# Altium footprint library Comp LIb.PcbLib: 34 footprints (part 2 of 3)
Each footprint in its own frame and in the unit in brackets; x right, y up, seen from the top. Pads: shape width x height; smd on the part's side, far side on the other; paste and mask are expansions set on the pad; w line width, h text height; cw(c..) or ccw(c..) is an arc to the next point about the centre after c.
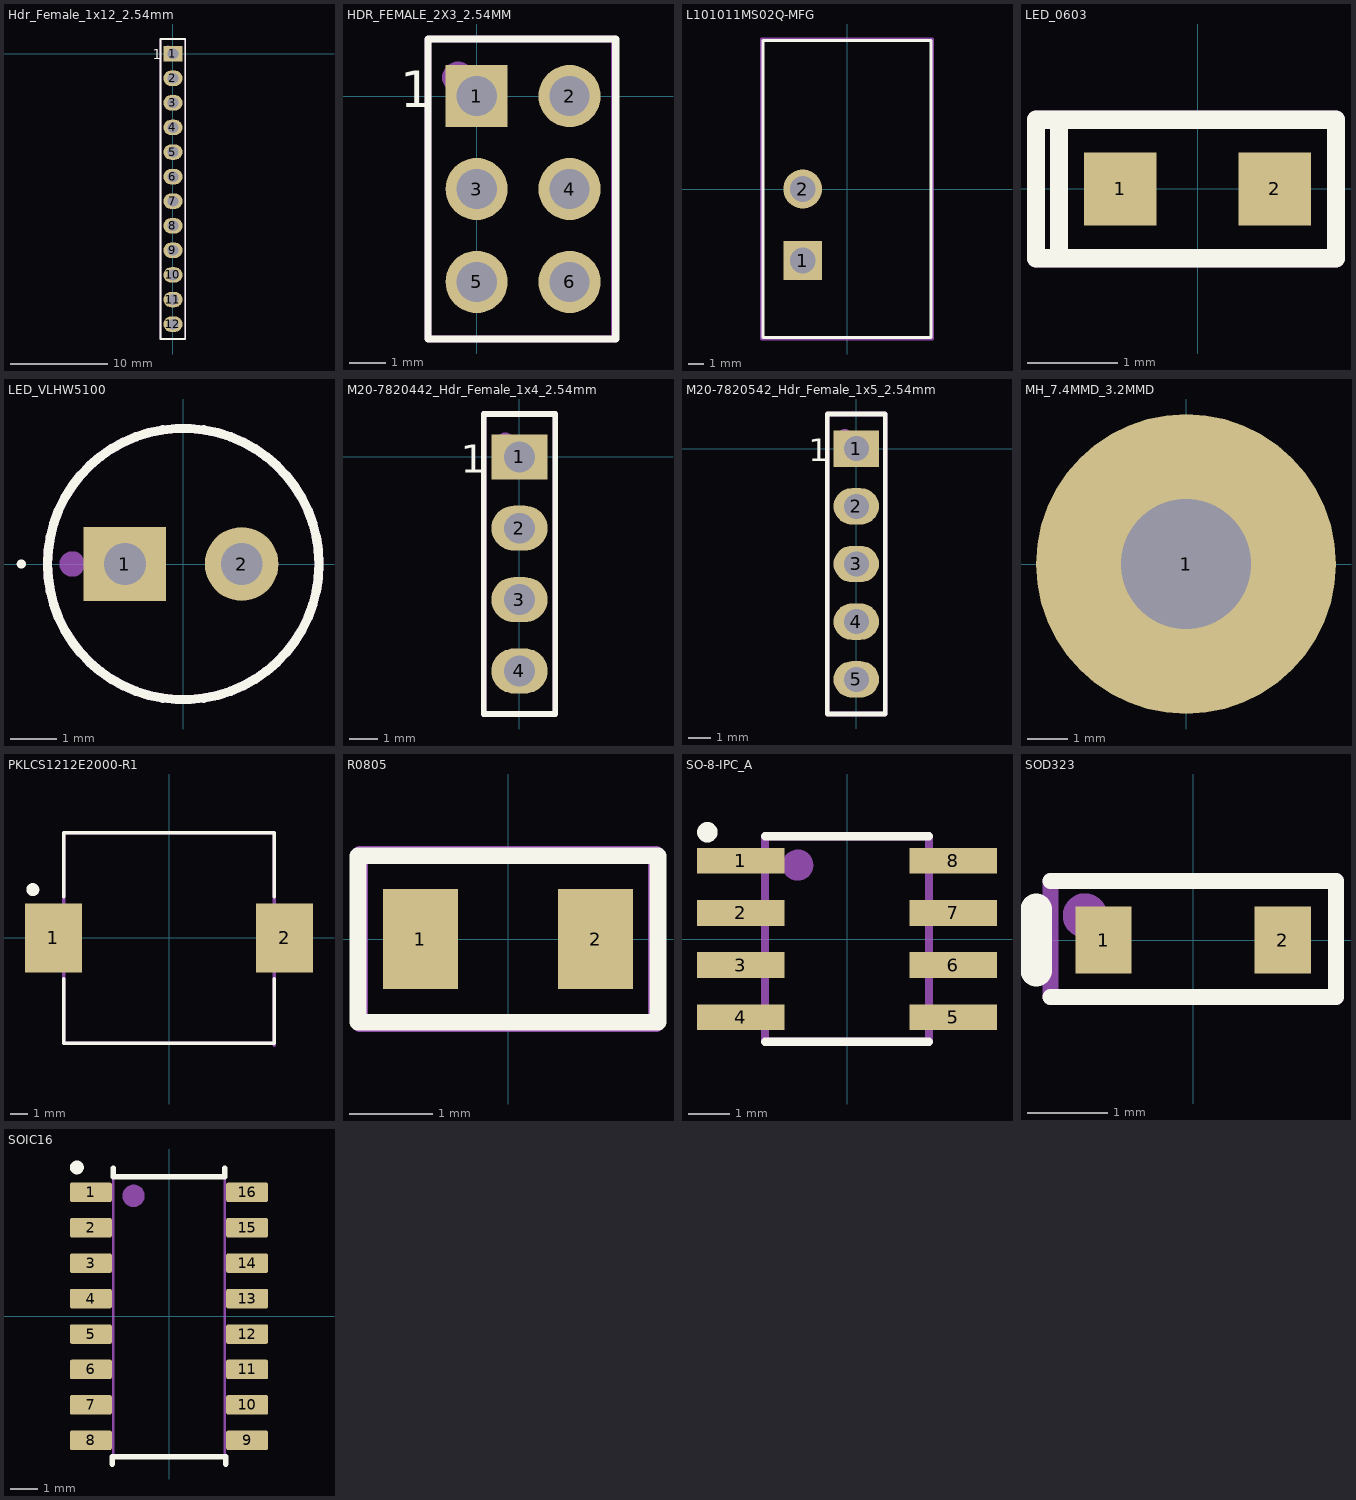
[diagram p1: the footprints below, top view; thin cyan lines are the x and y axes]

## Hdr_Female_1x12_2.54mm [mm]
pads (12):
  rect 2x1.6 hole 1.1: 1(0,0)
  oval 2x1.6 hole 1.1: 2(0,-2.54) 3(0,-5.08) 4(0,-7.62) 5(0,-10.16) 6(0,-12.7) 7(0,-15.24) 8(0,-17.78) 9(0,-20.32) 10(0,-22.86) 11(0,-25.4) 12(0,-27.94)
Top Overlay:
  lines w0.2: -1.27,-29.48 1.27,-29.48 ; -1.27,-29.464 -1.27,1.524 ; -1.27,-24.384 -1.27,1.524 ; 1.27,-29.464 1.27,1.524 ; 1.27,-24.384 1.27,1.524 ; -1.27,1.524 1.27,1.524 ; -1.27,1.524 1.27,1.524
  text "1" at -2.086,-0.562 h1
Mechanical 29:
  circle w0.5: c-0.508,0.508 r0.1
  lines w0.2: -1.27,-29.48 1.27,-29.48 ; -1.27,-29.464 -1.27,1.524 ; -1.27,-24.384 -1.27,1.524 ; 1.27,-29.464 1.27,1.524 ; 1.27,-24.384 1.27,1.524 ; -1.27,1.524 1.27,1.524 ; -1.27,1.524 1.27,1.524
  text ".Designator" at 0.878,-16.972 h1.8
3D body "m20-7821242.stp": height 8.51, standoff -2.99, extent -1.27,-29.41 1.23,1.47

## HDR_FEMALE_2X3_2.54MM [mm]
pads (6):
  rect 1.7x1.7 hole 1.1: 1(0,0)
  round 1.7 hole 1.1: 2(2.54,0) 3(0,-2.54) 4(2.54,-2.54) 5(0,-5.08) 6(2.54,-5.08)
Top Overlay:
  lines w0.2: -1.33,-6.64 3.8,-6.64 3.8,1.56 -1.33,1.56 -1.33,-6.64
  text "1" at -2.086,-0.308 h1
Mechanical 29:
  circle w0.508: c-0.508,0.508 r0.18
  lines w0.2: -1.33,-6.64 3.77,-6.64 3.77,1.56 -1.33,1.56 -1.33,-6.64
  text ".Designator" at 1.651,-4.064 h1.52
3D body "m20-7830342.stp": height 8.51, standoff -2.99, extent -1.33,-6.55 3.71,1.47

## L101011MS02Q-MFG [mm]
pads (2):
  rect 2.5x2.5 hole 1.65 paste-2539.97 mask+0: 1(-2.85,-4.6)
  round 2.5 hole 1.65 paste-2539.97 mask+0: 2(-2.85,0)
Top Overlay:
  lines w0.2: -5.395,-9.55 5.395,-9.55 5.395,9.55 -5.395,9.55 -5.395,-9.55
Mechanical 29:
  lines w0.2: -5.495,-9.65 -5.495,9.65 5.495,9.65 5.495,-9.65 -5.495,-9.65
  text ".Designator" at 1.293,-5.261 h2
3D body "Switch_C&K_Components_L101011MS02Q_eec.STEP": height 14.17, standoff -3.83, extent -5.397,-9.55 5.399,9.55

## LED_0603 [mm]
pads (2):
  rect 0.8x0.8 smd: 1(-0.85,0) 2(0.85,0)
Top Overlay:
  lines w0.2: -1.524,-0.762 -1.778,-0.762 -1.778,0.762 -1.524,0.762 ; -1.524,-0.762 -1.524,0.762 ; -1.524,-0.762 1.524,-0.762 1.524,0.762 -1.524,0.762
Mechanical 29:
  lines w0.2: -1.524,-0.762 -1.524,0.762 ; -1.778,-0.762 -1.778,0.762 1.524,0.762 1.524,-0.762 -1.778,-0.762
  text "--.Designator" at -0.916,-0.208 h0.6
3D body "SML-D12U8WT86.STEP": height 0.56, standoff 0.01, extent -0.8,-0.4 0.8,0.4
3D body: height 0.58, standoff 0.5, extent -0.2,-0.2 0.2,0.2

## LED_VLHW5100 [mm]
pads (2):
  rect 1.8x1.6 hole 0.91: 1(-1.27,0)
  round 1.6 hole 0.91: 2(1.27,0)
Top Overlay:
  lines w0.1: -3.57,0 ccw(c-3.52,0) -3.47,0 ccw(c-3.52,0) -3.57,0
  lines w0.2: -2.95,0 cw(c0,0) 2.95,0 cw(c0,0) -2.95,0
Mechanical 29:
  circle w0.3: c-2.413,0 r0.127
  lines w0.2: -2.95,0 cw(c0,0) 2.95,0 cw(c0,0) -2.95,0
  text ".Designator" at -2.186,-0.456 h1
3D body "80463LED_5mm_VLHW51.stp": height 8.6, standoff -16.4, extent -2.5,-2.945 2.938,2.945

## M20-7820442_Hdr_Female_1x4_2.54mm [mm] "comp: M20-7820442"
pads (4):
  rect 2x1.6 hole 1.1: 1(0,0)
  oval 2x1.6 hole 1.1: 2(0,-2.54) 3(0,-5.08) 4(0,-7.62)
Top Overlay:
  lines w0.2: -1.27,1.524 -1.27,-9.15 1.27,-9.15 1.27,1.524 ; -1.27,1.524 1.27,1.524 ; -1.27,1.524 1.27,1.524
  text "1" at -2.086,-0.562 h1
Mechanical 29:
  circle w0.5: c-0.508,0.508 r0.1
  lines w0.2: -1.27,-9.15 -1.27,1.524 ; -1.27,-9.15 -1.27,1.524 ; -1.27,-9.15 1.27,-9.15 ; -1.27,1.524 1.27,1.524 ; -1.27,1.524 1.27,1.524 ; 1.27,-9.15 1.27,1.524 ; 1.27,-9.15 1.27,1.524
  text ".Designator" at 0.517,-6.15 h1.3
3D body "m20-7820442.stp": height 8.51, standoff -2.99, extent -1.27,-9.093 1.23,1.467

## M20-7820542_Hdr_Female_1x5_2.54mm [mm] "comp: M20-7820542"
pads (5):
  rect 2x1.6 hole 1.1: 1(0,0)
  oval 2x1.6 hole 1.1: 2(0,-2.54) 3(0,-5.08) 4(0,-7.62) 5(0,-10.16)
Top Overlay:
  lines w0.2: -1.27,1.524 -1.27,-11.684 1.27,-11.684 1.27,1.524 ; -1.27,1.524 1.27,1.524 ; -1.27,1.524 1.27,1.524
  text "1" at -2.086,-0.562 h1
Mechanical 29:
  circle w0.5: c-0.508,0.508 r0.1
  lines w0.2: -1.27,-11.303 -1.27,1.524 ; 1.27,-11.303 1.27,1.524 ; -1.27,1.524 -1.27,-11.684 1.27,-11.684 1.27,1.524 ; -1.27,1.524 1.27,1.524 ; -1.27,1.524 1.27,1.524
  text ".Designator" at 0.791,-8.69 h1.6
3D body "m20-7820542.stp": height 8.51, standoff -2.99, extent -1.27,-11.63 1.23,1.47

## MH_7.4MMD_3.2MMD [mm]
pads (1):
  round 7.4 hole 3.2: 1(0,0)

## PCBComponent_1 [mm]

## PCBComponent_1 - duplicate [mm]

## PCBComponent_1 - duplicate1 [mm]

## PKLCS1212E2000-R1 [mm] "PKLCS1212E2000-R1"
pads (2):
  rect 3.3x4 smd paste+0 mask+0: 1(-6.7,0) 2(6.7,0)
Top Overlay:
  circle w0.5: c-7.9,2.8 r0.125
  lines w0.2: -6.1,-2.375 -6.1,-6.1 6.1,-6.1 6.1,-2.375 ; -6.1,2.375 -6.1,6.1 6.1,6.1 6.1,2.375
Mechanical 29:
  lines w0.2: 6.096,-6.223 6.096,6.096 -6.096,6.096 -6.096,-6.096 6.096,-6.096
  text ".Designator" at -3.61,-1.039 h2
3D body "Speak_Murata_PKLCS1212E2400-R1_eec.STEP": height 3, standoff 0, extent -6,-6 6,6

## R0805 [mm]
pads (2):
  rect 0.9x1.2 smd: 1(-1.05,0) 2(1.05,0)
Top Overlay:
  lines w0.2: -1.8,-1 1.8,-1 1.8,1 -1.8,1 -1.8,-1
Mechanical 29:
  lines w0.2: -1.778,-1.016 -1.778,1.016 1.778,1.016 1.778,-1.016 -1.778,-1.016
  text ".Designator" at -1.12,-0.218 h0.8
3D body "RC0805N_YAG.step": height 0.72, standoff 0.01, extent -1.003,-0.597 1.003,0.597

## SO-8-IPC_A [mm]
pads (8):
  rect 2.135x0.625 smd paste+0: 1(-2.586,1.905) 2(-2.586,0.635) 3(-2.586,-0.635) 4(-2.586,-1.905) 5(2.586,-1.905) 6(2.586,-0.635) 7(2.586,0.635) 8(2.586,1.905)
Top Overlay:
  circle w0.25: c-3.4,2.6 r0.125
  lines w0.2: -2,-2.5 2,-2.5 ; -2,2.5 2,2.5
Mechanical 29:
  circle w0.4: c-1.2,1.8 r0.18
  lines w0.2: -2,-2.5 2,-2.5 2,2.5 -2,2.5 -2,-2.5
  text ".Designator" at -1.05,-0.586 h2.2
3D body "Trans_Vishay_SI4848ADY-T1-GE3_eec.STEP": height 1.75, standoff 0, extent -3,-2.45 3,2.45

## SOD323 [mm]
pads (2):
  rect 0.7x0.83 smd: 1(-1.115,0) 2(1.115,0)
Top Overlay:
  lines w0.2: -1.778,-0.711 1.778,-0.711 1.778,0.737 -1.778,0.737
  lines w0.4: -1.956,-0.381 -1.956,0.381
Mechanical 29:
  circle w0.3: c-1.346,0.305 r0.127
  lines w0.2: -1.778,-0.711 1.778,-0.711 1.778,0.737 -1.778,0.737 -1.778,-0.711
  text ".Designator" at -0.8,-0.167 h0.4
3D body "User Library-SOD323.step": height 1, standoff 0.01, extent -1.25,-0.61 1.25,0.64

## SOIC16 [mm] "SOIC, 16-Leads, Body 10x4mm, Pitch 1.27mm, IPC High Density"
height 1.75
pads (16):
  rrect18% 1.5x0.7 smd: 1(-2.8,4.445) 2(-2.8,3.175) 3(-2.8,1.905) 4(-2.8,0.635) 5(-2.8,-0.635) 6(-2.8,-1.905) 7(-2.8,-3.175) 8(-2.8,-4.445) 9(2.8,-4.445) 10(2.8,-3.175) 11(2.8,-1.905) 12(2.8,-0.635) 13(2.8,0.635) 14(2.8,1.905) 15(2.8,3.175) 16(2.8,4.445)
Top Overlay:
  circle w0.25: c-3.302,5.334 r0.125
  lines w0.2: -2.032,-5.293 -2.032,-5.039 1.968,-5.039 ; -2,5.3 -2,5 2,5 2,5.3 ; 2.032,-5.293 2.032,-5.039 ; 1.968,-5.039 2.032,-5.039 ; 1.968,-5.039 2.032,-5.039
Mechanical 29:
  circle w0.4: c-1.27,4.318 r0.2
  lines w0.1: -2,-5 2,-5 2,5 -2,5 -2,-5
  text ".Designator" at -1.531,-0.319 h0.8
3D body "SOIC-16akaD0016AakaM16A.stp": height 1.59, standoff -0.01, extent -2.997,-4.953 2.997,4.953